# Altium footprint library mastermind.PCBLIB: 1061 footprints (part 59 of 67)
Each footprint in its own frame and in the unit in brackets; x right, y up, seen from the top. Pads: shape width x height; smd on the part's side, far side on the other; paste and mask are expansions set on the pad; w line width, h text height; cw(c..) or ccw(c..) is an arc to the next point about the centre after c.
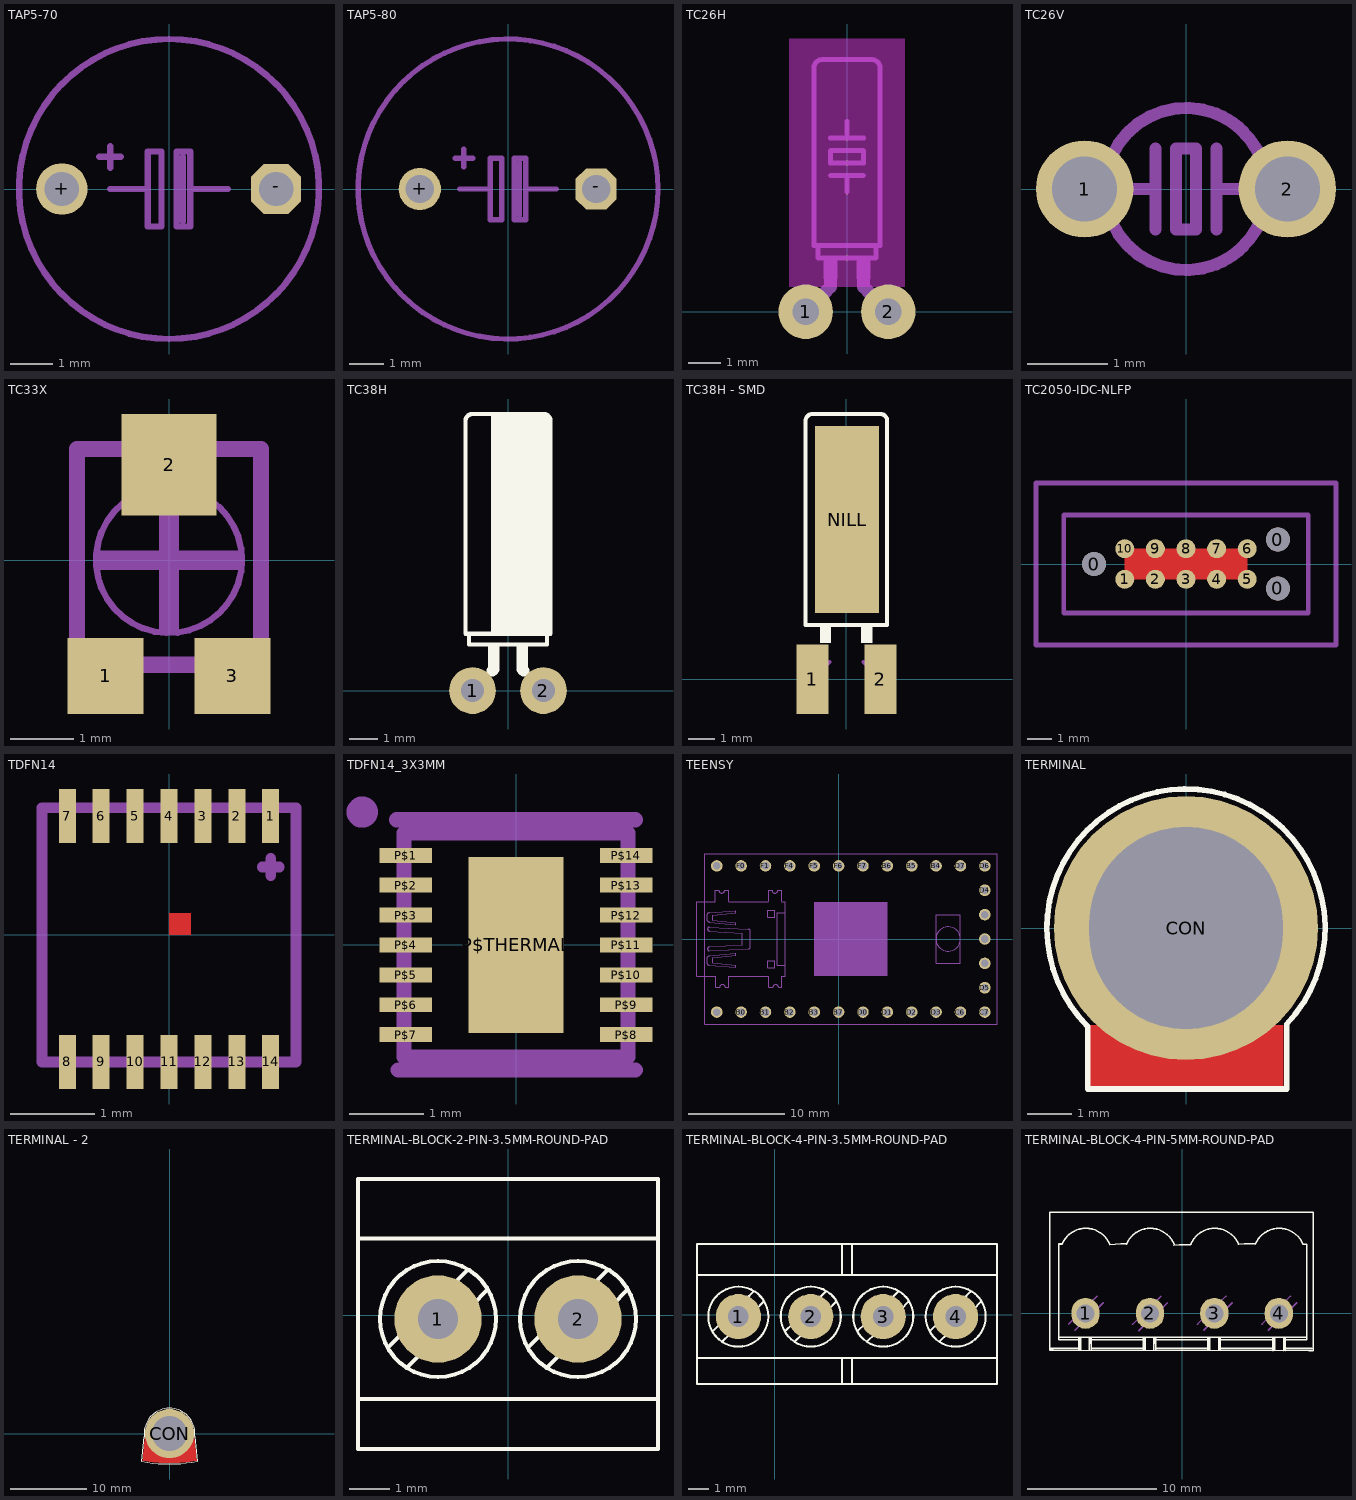
[diagram p58: the footprints below, top view; thin cyan lines are the x and y axes]

## TAP5-70 [mil]
pads (2):
  round 48 hole 32: +(-100,0)
  oct 46.48x46.48 hole 32: -(100,0)
Mechanical 2:
  lines w6: -132.87,-44.09 ccw(c0,0) 132.87,-44.09 ; -132.87,44.09 cw(c0,0) 132.87,44.09 ; -65,30 -45,30 ; -55,0 -20,0 ; -55,20 -55,40 ; 13,-30 13,30 ; 55,0 20,0 ; -20,0 -20,-35 -7,-35 -7,35 -20,35 -20,0 ; 20,0 20,-35 7,-35 7,35 20,35 20,0
Mechanical 8:
  lines w6: -132.87,-44.09 cw(c0,0) -132.87,44.09 ; 132.87,-44.09 ccw(c0,0) 132.87,44.09

## TAP5-80 [mil]
pads (2):
  round 48 hole 32: +(-100,0)
  oct 46.48x46.48 hole 32: -(100,0)
Mechanical 2:
  circle w6: c0,0 r170
  lines w6: -60,35 -40,35 ; -55,0 -20,0 ; -50,25 -50,45 ; 13,-30 13,30 ; 55,0 20,0 ; -20,0 -20,-35 -7,-35 -7,35 -20,35 -20,0 ; 20,0 20,-35 7,-35 7,35 20,35 20,0

## TC26H [mil]
pads (2):
  round 66 hole 32: 1(-50,0) 2(50,0)
Top Layer keep-out:
  region: -70,30 -70,330 70,330 70,30
Mechanical 2:
  region: 12,40 12,63 28,63 28,40
  region: -28,40 -28,63 -12,63 -12,40
  lines w6: -20,165 0,165 ; -20,210 0,210 ; 0,145 0,165 ; 0,230 0,210 ; 20,165 0,165 ; 20,210 0,210 ; -35,80 -35,65 35,65 35,80 ; -35,80 -40,80 -40,295 cw(c-30,295) -30,305 30,305 cw(c30,295) 40,295 40,80 35,80 ; -35,80 35,80 ; -20,180 -20,195 20,195 20,180 -20,180
  lines w16: -20,30 -20,50 ; 20,30 20,45
Mechanical 8:
  lines w16: -50,0 -25,25 ; 25,25 50,0

## TC26V [mil]
pads (2):
  round 48 hole 32: 1(-50,0) 2(50,0)
Mechanical 2:
  lines w6: -28.28,-28.28 ccw(c0.01,0) 0,-40 ccw(c-0.01,0) 28.28,-28.28 ; -28.28,28.28 cw(c0.01,0) 0,40 cw(c-0.01,0) 28.28,28.28
Mechanical 8:
  circle w6: c0,0 r40
  lines w6: -30,0 -15,0 ; -15,-20 -15,0 ; -15,20 -15,0 ; 15,-20 15,0 ; 15,20 15,0 ; 30,0 15,0 ; -5,-20 -5,20 5,20 5,-20 -5,-20

## TC33X [mm]
pads (3):
  rect 1.2x1.2 smd: 1(-1,-1.825) 3(1,-1.825)
  rect 1.5x1.6 smd: 2(0,1.5)
Mechanical 2:
  lines w0.254: -1.45,-0.4 -1.45,1.75 -0.85,1.75 ; 0.85,1.75 1.45,1.75 1.45,-0.4
Mechanical 8:
  circle w0.102: c0,0 r1.15
  region: -1.15,-0.15 -1.15,0.15 1.15,0.15 1.15,-0.15
  region: -0.15,-1.15 -0.15,1.15 0.15,1.15 0.15,-1.15
  lines w0.254: -1.45,-1.65 -1.45,1.75 1.45,1.75 1.45,-1.65 -1.45,-1.65

## TC38H [mil]
pads (2):
  round 66 hole 32.01: 1(-50,0)
  round 66 hole 32: 2(50,0)
Top Overlay:
  rectangle: -24,78 59,389
  region: 12,40 12,63 28,63 28,40
  region: -28,40 -28,63 -12,63 -12,40
  lines w6: -55,80 -55,65 55,65 55,80 ; -55,80 -60,80 -60,380 cw(c-50,380) -50,390 50,390 cw(c50,380) 60,380 60,80 55,80 ; -55,80 55,80
  lines w16: -22,28 -20,30 -20,40 ; 20,45 20,30 22,28
Mechanical 8:
  lines w6: -50,0 -25,25 ; 25,25 50,0
3D body "User Library-DT-26-1.step": height 78.74, standoff -78.74, extent -40.36,0.12 38.37,281.22

## TC38H - SMD [mm]
pads (3):
  rect 1.2x2.6 smd: 1(-1.27,0) 2(1.27,0)
  rect 2.4x7 smd: NILL(0.023,5.964)
Top Overlay:
  region: -0.983,1.354 -0.983,1.939 -0.577,1.939 -0.577,1.354
  region: 0.553,1.356 0.553,1.94 0.959,1.94 0.959,1.356
  lines w0.152: -1.524,2.032 -1.397,2.032 1.397,2.032 1.524,2.032 1.524,9.652 ccw(c1.27,9.652) 1.27,9.906 -1.27,9.906 ccw(c-1.27,9.652) -1.524,9.652 -1.524,2.032
Mechanical 8:
  lines w0.152: -1.27,0 -0.635,0.635 ; 0.635,0.635 1.27,0
3D body "User Library-DT-26-1.step": height 2, standoff -2, extent -1.002,2.003 0.998,9.143

## TC2050-IDC-NLFP [mil]
pads (13):
  round 39 hole 39 unplated: 0(-150,0) 0(150,-40) 0(150,40)
  round 31 smd paste-196.85: 1(-100,-25) 2(-50,-25) 3(0,-25) 4(50,-25) 5(100,-25) 6(100,25) 7(50,25) 8(0,25) 9(-50,25) 10(-100,25)
Top Layer:
  pour cut-out: -100,25 -100,-25 100,-25 100,25
Mechanical 15:
  lines w7.87: -245,-132.5 -245,132.5 245,132.5 245,-132.5 -245,-132.5 ; -199.8,-79.92 -199.8,79.92 199.8,79.92 199.8,-79.92 -199.8,-79.92

## TDFN14 [mil]
pads (14):
  rect 7.87x25.2 smd: 1(47.24,55.12) 2(31.5,55.12) 3(15.75,55.12) 4(0,55.12) 5(-15.75,55.12) 6(-31.5,55.12) 7(-47.24,55.12) 8(-47.24,-59.06) 9(-31.5,-59.06) 10(-15.75,-59.06) 11(0,-59.06) 12(15.75,-59.06) 13(31.5,-59.06) 14(47.24,-59.06)
Top Layer:
  region: 0,0 10,0 10,10 0,10
Top Paste:
  region: 0,0 10,0 10,10 0,10
  region: 0,0 10,0 10,10 0,10
  region: 0,0 10,0 10,10 0,10
  region: 0,0 10,0 10,10 0,10
  region: 0,0 10,0 10,10 0,10
  region: 0,0 10,0 10,10 0,10
  region: 0,0 10,0 10,10 0,10
  region: 0,0 10,0 10,10 0,10
Top Solder:
  region: 0,0 10,0 10,10 0,10
Mechanical 2:
  lines w5: 43.31,31.5 51.18,31.5 ; 47.24,27.56 47.24,35.43 ; -59.06,-59.06 -59.06,59.06 59.06,59.06 59.06,-59.06 -59.06,-59.06

## TDFN14_3X3MM [mil]
pads (15):
  rect 27.56x7.87 smd paste-13.78 mask-13.78: P$1(-58.07,47.24) P$2(-58.07,31.5) P$3(-58.07,15.75) P$4(-58.07,0) P$5(-58.07,-15.75) P$6(-58.07,-31.5) P$7(-58.07,-47.24) P$8(58.07,-47.24) P$9(58.07,-31.5) P$10(58.07,-15.75) P$11(58.07,0) P$12(58.07,15.75) P$13(58.07,31.5) P$14(58.07,47.24)
  rect 50x92.52 smd paste-46.26: P$THERMAL(0,0)
Top Paste:
  region: 71.85,-43.31 71.85,-51.18 44.29,-51.18 44.29,-43.31
  region: 71.85,-27.56 71.85,-35.43 44.29,-35.43 44.29,-27.56
  region: 71.85,-11.81 71.85,-19.69 44.29,-19.69 44.29,-11.81
  region: 71.85,3.94 71.85,-3.94 44.29,-3.94 44.29,3.94
  region: 71.85,19.69 71.85,11.81 44.29,11.81 44.29,19.69
  region: 71.85,35.43 71.85,27.56 44.29,27.56 44.29,35.43
  region: 71.85,51.18 71.85,43.31 44.29,43.31 44.29,51.18
  region: -71.85,-51.18 -71.85,-43.31 -44.29,-43.31 -44.29,-51.18
  region: -71.85,-35.43 -71.85,-27.56 -44.29,-27.56 -44.29,-35.43
  region: -71.85,-19.69 -71.85,-11.81 -44.29,-11.81 -44.29,-19.69
  region: -71.85,-3.94 -71.85,3.94 -44.29,3.94 -44.29,-3.94
  region: -71.85,11.81 -71.85,19.69 -44.29,19.69 -44.29,11.81
  region: -71.85,27.56 -71.85,35.43 -44.29,35.43 -44.29,27.56
  region: -71.85,43.31 -71.85,51.18 -44.29,51.18 -44.29,43.31
  region: 3.94,-39.37 3.94,-7.87 19.69,-7.87 19.69,-39.37
  region: -19.69,-39.37 -19.69,-7.87 -3.94,-7.87 -3.94,-39.37
  region: 3.94,7.87 3.94,39.37 19.69,39.37 19.69,7.87
  region: -19.69,7.87 -19.69,39.37 -3.94,39.37 -3.94,7.87
Top Solder:
  region: 41.34,-54.13 41.34,54.13 74.8,54.13 74.8,-54.13
  region: -74.8,-54.13 -74.8,54.13 -41.34,54.13 -41.34,-54.13
Mechanical 2:
  circle w12: c-81,70 r2.24
  lines w8: -62.99,65.94 62.99,65.94 ; -62.01,-65.94 62.99,-65.94
Mechanical 8:
  lines w8: -59.06,-59.06 -59.06,59.06 59.06,59.06 59.06,-59.06 -59.06,-59.06

## TEENSY [mil]
pads (29):
  round 47.25 hole 31.5: B0(-400,-300) B1(-300,-300) B2(-200,-300) B3(-100,-300) B4(400,300) B5(300,300) B6(200,300) B7(0,-300) C6(500,-300) C7(600,-300) D0(100,-300) D1(200,-300) D2(300,-300) D3(400,-300) D4(600,200) D5(600,-200) D6(600,300) D7(500,300) F0(-400,300) F1(-300,300) F4(-200,300) F5(-100,300) F6(0,300) F7(100,300) GND(-500,-300) GND2(600,0) RST(600,100) VCC(600,-100) VCC1(-500,300)
Mechanical 2:
  circle w5: c450,0 r50
  region: -100,-150 -100,150 200,150 200,-150
  lines w4: -538.04,40.87 -538.04,40.88
  lines w5: -423.62,-153.54 -317.32,-153.54 ; -423.62,153.54 -317.32,153.54 ; -218.9,-125.98 -218.9,-82.68 ; -218.9,82.68 -218.9,125.98 ; -550,-350 650,-350 650,350 -550,350 -550,-350 ; 400,-100 500,-100 500,100 400,100 400,-100
Mechanical 8:
  lines w4: -538.04,40.87 ccw(c-529.87,40.88) -529.86,32.7 -394.97,24.53 -394.97,-24.52 -529.86,-32.69 ccw(c-529.86,-40.87) -538.04,-40.87 ccw(c-529.87,-40.87) -529.86,-49.04 -370.44,-40.87 ccw(c-370.92,-32.22) -362.27,-32.69 -362.27,32.7 ccw(c-370.92,32.23) -370.44,40.88 -529.86,49.05 ccw(c-529.87,40.88) -538.04,40.88 ; -505.49,153.94 -505.49,199.21 ; -505.12,200 -491.34,200 ccw(c-479.53,200) -467.72,200 -451.97,200 ; -504.69,-198.03 -504.69,-152.76 ; -503.94,-198.82 -488.19,-198.82 cw(c-476.38,-198.82) -464.57,-198.82 -450.79,-198.82 ; -451.21,153.94 -451.21,199.21 ; -450.42,-198.03 -450.42,-152.76 ; -287.38,153.94 -287.38,199.21 ; -287.01,200 -273.23,200 ccw(c-261.42,200) -249.61,200 -233.86,200 ; -286.58,-198.03 -286.58,-152.76 ; -285.83,-198.82 -270.08,-198.82 cw(c-258.27,-198.82) -246.46,-198.82 -232.68,-198.82 ; -233.1,153.94 -233.1,199.21 ; -232.31,-198.03 -232.31,-152.76 ; -222.83,-108.27 -252.36,-108.27 -252.36,108.27 -222.83,108.27 ; -540.08,-100.14 ccw(c-528.98,-96.74) -529.86,-108.32 -421.54,-116.49 -421.54,-108.32 -515.56,-98.1 -515.56,-77.66 -421.54,-67.44 -421.54,-59.26 -529.86,-69.48 ccw(c-528.98,-81.06) -540.08,-77.66 ccw(c-503.43,-88.9) -540.08,-100.14 ; -540.08,77.67 cw(c-503.43,88.91) -540.08,100.15 cw(c-528.99,96.75) -529.86,108.32 -421.54,116.5 -421.54,108.32 -515.56,98.11 -515.56,77.67 -421.54,67.45 -421.54,59.27 -529.86,69.49 cw(c-528.98,81.07) -540.08,77.67 ; -291.73,-118.11 -291.73,-88.58 -262.2,-88.58 -262.2,-118.11 -291.73,-118.11 ; -291.73,88.58 -262.2,88.58 -262.2,118.11 -291.73,118.11 -291.73,88.58
  lines w5: -581.1,-153.54 -506.3,-153.54 ; -581.1,153.54 -506.3,153.54 ; -450.79,153.54 -289.37,153.54 ; -448.82,-153.54 -287.4,-153.54 ; -232.68,153.54 -218.9,153.54 ; -230.71,-153.54 -218.9,-153.54
Mechanical 9:
  lines w5: -581.1,-153.54 -581.1,153.54 ; -218.9,-153.54 -218.9,153.54

## TERMINAL [mm]
pads (1):
  round 6 hole 4.4 slot 4.6 at 90 deg: CON(0,0)
Top Layer:
  region: -2.21,-2.21 2.21,-2.21 2.21,-3.581 -2.21,-3.581
Top Overlay:
  lines w0.127: -2.235,-3.658 2.286,-3.658 2.286,-2.184 ccw(c0,0) -2.235,-2.235 -2.235,-3.658
Top Solder:
  region: -2.184,-2.21 2.235,-2.21 2.235,-3.581 -2.184,-3.581
3D body "CopperTerminal.STEP": height 6, standoff -2.4, extent -2.55,-5.306 2.55,2.55

## TERMINAL - 2 [mm]
pads (1):
  round 6.5 hole 4.6: CON(0,0)
Top Layer:
  region: -3.556,-3.556 -3.116,-3.634 -2.23,-3.75 -1.34,-3.828 -0.447,-3.867 0.447,-3.867 1.34,-3.828 2.23,-3.75 3.116,-3.634 3.556,-3.556 3.175,0 3.116,0.261 2.915,0.756 2.637,1.212 2.287,1.616 1.877,1.958 1.416,2.229 0.917,2.421 0.394,2.529 0.127,2.54 -0.154,2.54 -0.707,2.448 -1.238,2.267 -1.733,2.001 -2.177,1.659 -2.561,1.249 -2.872,0.782 -3.103,0.271 -3.175,0
Top Overlay:
  lines w0.127: -3.688,-3.677 ccw(c-0.073,15.782) 3.671,-3.653 ; -3.687,-3.674 -3.33,-0.43 ; -3.322,-0.431 cw(c0,0) 3.328,-0.381 ; 3.327,-0.381 3.665,-3.653
Top Solder:
  region: -3.556,-3.556 -3.116,-3.634 -2.23,-3.75 -1.34,-3.828 -0.447,-3.867 0.447,-3.867 1.34,-3.828 2.23,-3.75 3.116,-3.634 3.556,-3.556 3.175,0 3.116,0.261 2.915,0.756 2.637,1.212 2.287,1.616 1.877,1.958 1.416,2.229 0.917,2.421 0.394,2.529 0.127,2.54 -0.154,2.54 -0.707,2.448 -1.238,2.267 -1.733,2.001 -2.177,1.659 -2.561,1.249 -2.872,0.782 -3.103,0.271 -3.175,0

## TERMINAL-BLOCK-2-PIN-3.5MM-ROUND-PAD [mm]
pads (2):
  round 2.184 / inner round 1.524 / far side round 1.7 hole 1: 1(-1.75,-0.1) 2(1.75,-0.1)
Top Overlay:
  circle w0.102: c1.75,-0.1 r1.45
  circle w0.102: c-1.75,-0.1 r1.45
  lines w0.102: -2.972,-0.787 -2.624,-0.44 ; -2.515,-1.295 -2.167,-0.948 ; -1.384,0.749 -1.037,1.097 ; -0.881,0.262 -0.533,0.61 ; 0.528,-0.787 0.876,-0.44 ; 0.986,-1.295 1.333,-0.948 ; 2.116,0.749 2.463,1.097 ; 2.619,0.262 2.967,0.61 ; -3.75,-2.099 -3.75,-1.616 -3.75,1.437 -3.75,1.912 ; -3.75,-2.099 3.75,-2.099 ; -3.75,-2.099 -3.75,-2.911 -3.75,-3.35 3.75,-3.35 3.75,-2.911 3.75,-2.099 ; -3.75,1.912 -3.75,3.4 3.75,3.4 3.75,1.912 ; -3.75,1.912 3.75,1.912 ; 3.75,-2.099 3.75,-1.616 3.75,1.437 3.75,1.912
3D body "Screw Terminal Block 3.5mm Blue 2-way.step": height 8.4, standoff -2, extent -3.65,-3.4 3.65,3.4

## TERMINAL-BLOCK-4-PIN-3.5MM-ROUND-PAD [mm]
pads (4):
  round 2.184 / inner round 1.524 / far side round 1.7 hole 1: 1(-1.75,-0.1) 2(1.75,-0.1) 3(5.25,-0.1) 4(8.75,-0.1)
Top Overlay:
  circle w0.102: c1.75,-0.1 r1.45
  circle w0.102: c-1.75,-0.1 r1.45
  circle w0.102: c8.75,-0.1 r1.45
  circle w0.102: c5.25,-0.1 r1.45
  lines w0.102: -2.972,-0.787 -2.624,-0.44 ; -2.515,-1.295 -2.167,-0.948 ; -1.384,0.749 -1.037,1.097 ; -0.881,0.262 -0.533,0.61 ; 0.528,-0.787 0.876,-0.44 ; 0.986,-1.295 1.333,-0.948 ; 2.116,0.749 2.463,1.097 ; 2.619,0.262 2.967,0.61 ; 4.028,-0.787 4.376,-0.44 ; 4.486,-1.295 4.833,-0.948 ; 5.616,0.749 5.963,1.097 ; 6.119,0.262 6.467,0.61 ; 7.528,-0.787 7.876,-0.44 ; 7.986,-1.295 8.333,-0.948 ; 9.116,0.749 9.464,1.097 ; 9.619,0.262 9.967,0.61 ; -3.75,-2.099 -3.75,-1.616 -3.75,1.437 -3.75,1.912 ; -3.75,-2.099 3.75,-2.099 3.75,-2.911 3.75,-3.35 -3.75,-3.35 -3.75,-2.911 -3.75,-2.099 ; -3.75,1.912 -3.75,3.4 3.75,3.4 3.75,1.912 -3.75,1.912 ; 10.75,-2.099 3.25,-2.099 3.25,-2.911 3.25,-3.35 10.75,-3.35 10.75,-2.911 10.75,-2.099 ; 10.75,-2.099 10.75,-1.616 10.75,1.437 10.75,1.912 ; 10.75,1.912 3.25,1.912 3.25,3.4 10.75,3.4 10.75,1.912
3D body "Screw Terminal Block 3.5mm Blue 2-way.step": height 8.4, standoff -2, extent -3.65,-3.4 3.65,3.4
3D body "Screw Terminal Block 3.5mm Blue 2-way.step": height 8.4, standoff -2, extent 3.35,-3.4 10.65,3.4

## TERMINAL-BLOCK-4-PIN-5MM-ROUND-PAD [mm]
pads (4):
  oval 2.2x2.4 / inner round 1.524 / far side oval 2.2x3.2 hole 1.4: 1(-7.5,0) 2(-2.5,0) 3(2.5,0) 4(7.5,0)
Top Overlay:
  lines w0.127: -10.221,-2.727 -8.016,-2.727 ; -9.59,-1.854 9.654,-1.854 9.654,-2.047 8.022,-2.047 ; -8.018,-2.047 -9.59,-2.047 -9.59,5.054 -9.59,5.374 -9.317,5.374 cw(c-7.474,4.598) -5.626,5.362 ; -8.018,-1.86 -8.016,-2.873 ; -7.888,-1.858 -7.886,-2.874 ; -7.198,-1.889 -7.196,-2.877 ; -7.069,-2.047 -3.014,-2.047 ; -7.069,-1.879 -7.068,-2.857 ; -7.067,-2.727 -3.012,-2.727 ; -5.621,5.321 cw(c-4.701,-1.256) -4.317,5.374 cw(c-2.474,4.598) -0.626,5.362 ; -3.014,-1.885 -3.012,-2.858 ; -2.884,-1.876 -2.882,-2.879 ; -2.194,-1.896 -2.192,-2.879 ; -2.065,-2.047 2.006,-2.047 ; -2.065,-1.881 -2.063,-2.873 ; -2.063,-2.727 2.007,-2.727 ; -0.641,5.268 cw(c0.278,-1.308) 0.662,5.321 ; 0.683,5.374 cw(c2.526,4.598) 4.374,5.362 ; 2.005,-1.879 2.007,-2.879 ; 2.135,-1.879 2.137,-2.881 ; 2.825,-1.879 2.827,-2.879 ; 2.954,-2.047 7.049,-2.047 ; 2.954,-1.877 2.956,-2.876 ; 2.956,-2.727 7.05,-2.727 ; 4.376,5.344 cw(c5.295,-1.233) 5.679,5.397 ; 5.683,5.374 cw(c7.526,4.598) 9.374,5.362 9.654,5.362 9.654,-1.874 ; 7.049,-1.875 7.05,-2.886 ; 7.179,-1.886 7.18,-2.874 ; 7.869,-1.883 7.87,-2.896 ; 7.997,-1.882 7.999,-2.898 ; 7.999,-2.727 9.825,-2.727 10.054,-2.727 ; -10.266,-2.88 -10,-2.88 9.84,-2.9 10.16,-2.9 10.16,7.84 -10.266,7.84 -10.266,-2.88
Mechanical 8:
  lines w0.127: -8.806,-0.837 -6.596,1.335 ; -8.324,-1.319 -6.114,0.827 ; -3.861,-0.862 -1.651,1.31 ; -3.378,-1.345 -1.168,0.802 ; 1.194,-0.837 3.404,1.335 ; 1.676,-1.319 3.886,0.827 ; 6.194,-0.837 8.404,1.335 ; 6.676,-1.319 8.886,0.827
3D body "15EDGK-5.08-04P-14-00A(H).stp": height 7.67, standoff -3.43, extent -10.41,1.28 9.91,16.78
3D body "15EDGRC-5.08- 04P-14-00A(H).stp": height 7.2, standoff -3.4, extent -10.21,-1.36 10.11,7.84